# Altium footprint library Texas Instruments Footprints.PcbLib: 429 footprints (part 8 of 32)
Each footprint in its own frame and in the unit in brackets; x right, y up, seen from the top. Pads: shape width x height; smd on the part's side, far side on the other; paste and mask are expansions set on the pad; w line width, h text height; cw(c..) or ccw(c..) is an arc to the next point about the centre after c.
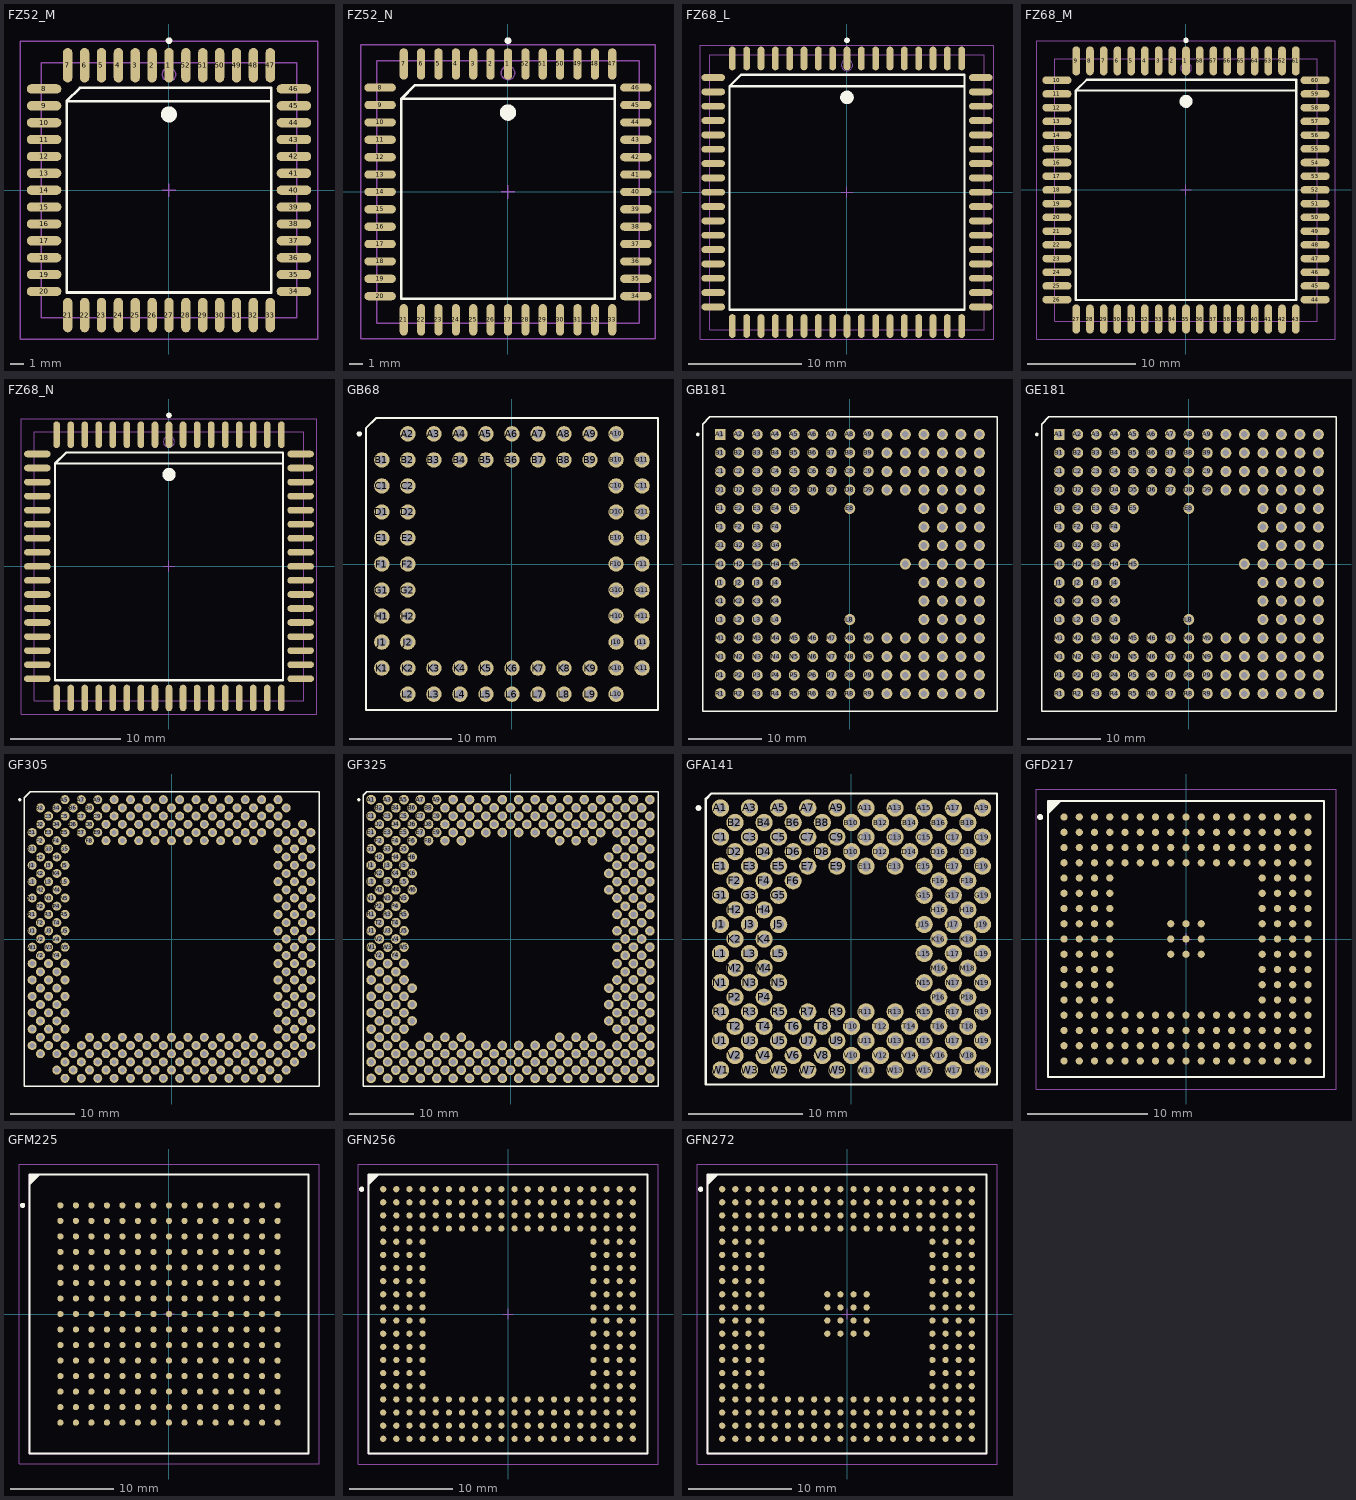
[diagram p7: the footprints below, top view; thin cyan lines are the x and y axes]

## FZ52_M [mm] "52-Pin Leaded Chip Carrier 1.27 mm Pitch, IPC Low Density"
height 4.57
pads (52):
  oval 0.7x2.6 smd: 1(0,9.4) 2(-1.27,9.4) 3(-2.54,9.4) 4(-3.81,9.4) 5(-5.08,9.4) 6(-6.35,9.4) 7(-7.62,9.4) 21(-7.62,-9.4) 22(-6.35,-9.4) 23(-5.08,-9.4) 24(-3.81,-9.4) 25(-2.54,-9.4) 26(-1.27,-9.4) 27(0,-9.4) 28(1.27,-9.4) 29(2.54,-9.4) 30(3.81,-9.4) 31(5.08,-9.4) 32(6.35,-9.4) 33(7.62,-9.4) 47(7.62,9.4) 48(6.35,9.4) 49(5.08,9.4) 50(3.81,9.4) 51(2.54,9.4) 52(1.27,9.4)
  oval 2.6x0.7 smd: 8(-9.4,7.62) 9(-9.4,6.35) 10(-9.4,5.08) 11(-9.4,3.81) 12(-9.4,2.54) 13(-9.4,1.27) 14(-9.4,0) 15(-9.4,-1.27) 16(-9.4,-2.54) 17(-9.4,-3.81) 18(-9.4,-5.08) 19(-9.4,-6.35) 20(-9.4,-7.62) 34(9.4,-7.62) 35(9.4,-6.35) 36(9.4,-5.08) 37(9.4,-3.81) 38(9.4,-2.54) 39(9.4,-1.27) 40(9.4,0) 41(9.4,1.27) 42(9.4,2.54) 43(9.4,3.81) 44(9.4,5.08) 45(9.4,6.35) 46(9.4,7.62)
Top Overlay:
  circle w0.25: c0,11.25 r0.125
  circle w0.6: c0,5.7 r0.3
  lines w0.2: 7.7,6.7 -7.7,6.7 ; -7.7,6.7 -6.7,7.7 7.7,7.7 7.7,-7.7 -7.7,-7.7 -7.7,6.7
Mechanical 13:
  circle w0.1: c0,8.7 r0.5
  lines w0.1: -9.6,-9.6 -9.6,9.6 9.6,9.6 9.6,-9.6 -9.6,-9.6
Mechanical 15:
  lines w0.1: -0.5,0 0.5,0 ; 0,-0.5 0,0.5 ; -11.2,-11.2 -11.2,11.2 11.2,11.2 11.2,-11.2 -11.2,-11.2
3D body: height 4.57, standoff 0, extent -9.6,-9.6 9.6,9.6

## FZ52_N [mm] "52-Pin Leaded Chip Carrier 1.27 mm Pitch, IPC Medium Density"
height 4.57
pads (52):
  oval 0.6x2.3 smd: 1(0,9.35) 2(-1.27,9.35) 3(-2.54,9.35) 4(-3.81,9.35) 5(-5.08,9.35) 6(-6.35,9.35) 7(-7.62,9.35) 21(-7.62,-9.35) 22(-6.35,-9.35) 23(-5.08,-9.35) 24(-3.81,-9.35) 25(-2.54,-9.35) 26(-1.27,-9.35) 27(0,-9.35) 28(1.27,-9.35) 29(2.54,-9.35) 30(3.81,-9.35) 31(5.08,-9.35) 32(6.35,-9.35) 33(7.62,-9.35) 47(7.62,9.35) 48(6.35,9.35) 49(5.08,9.35) 50(3.81,9.35) 51(2.54,9.35) 52(1.27,9.35)
  oval 2.3x0.6 smd: 8(-9.35,7.62) 9(-9.35,6.35) 10(-9.35,5.08) 11(-9.35,3.81) 12(-9.35,2.54) 13(-9.35,1.27) 14(-9.35,0) 15(-9.35,-1.27) 16(-9.35,-2.54) 17(-9.35,-3.81) 18(-9.35,-5.08) 19(-9.35,-6.35) 20(-9.35,-7.62) 34(9.35,-7.62) 35(9.35,-6.35) 36(9.35,-5.08) 37(9.35,-3.81) 38(9.35,-2.54) 39(9.35,-1.27) 40(9.35,0) 41(9.35,1.27) 42(9.35,2.54) 43(9.35,3.81) 44(9.35,5.08) 45(9.35,6.35) 46(9.35,7.62)
Top Overlay:
  circle w0.25: c0,11.05 r0.125
  circle w0.6: c0,5.8 r0.3
  lines w0.2: 7.8,6.8 -7.8,6.8 ; -7.8,6.8 -6.8,7.8 7.8,7.8 7.8,-7.8 -7.8,-7.8 -7.8,6.8
Mechanical 13:
  circle w0.1: c0,8.7 r0.5
  lines w0.1: -9.6,-9.6 -9.6,9.6 9.6,9.6 9.6,-9.6 -9.6,-9.6
Mechanical 15:
  lines w0.1: -0.5,0 0.5,0 ; 0,-0.5 0,0.5 ; -10.75,-10.75 -10.75,10.75 10.75,10.75 10.75,-10.75 -10.75,-10.75
3D body: height 4.57, standoff 0, extent -9.6,-9.6 9.6,9.6

## FZ68_L [mm] "68-Pin Leaded Chip Carrier 1.27 mm Pitch, IPC High Density"
height 4.57
pads (68):
  oval 0.6x2.1 smd: 1(0,11.85) 2(-1.27,11.85) 3(-2.54,11.85) 4(-3.81,11.85) 5(-5.08,11.85) 6(-6.35,11.85) 7(-7.62,11.85) 8(-8.89,11.85) 9(-10.16,11.85) 27(-10.16,-11.85) 28(-8.89,-11.85) 29(-7.62,-11.85) 30(-6.35,-11.85) 31(-5.08,-11.85) 32(-3.81,-11.85) 33(-2.54,-11.85) 34(-1.27,-11.85) 35(0,-11.85) 36(1.27,-11.85) 37(2.54,-11.85) 38(3.81,-11.85) 39(5.08,-11.85) 40(6.35,-11.85) 41(7.62,-11.85) 42(8.89,-11.85) 43(10.16,-11.85) 61(10.16,11.85) 62(8.89,11.85) 63(7.62,11.85) 64(6.35,11.85) 65(5.08,11.85) 66(3.81,11.85) 67(2.54,11.85) 68(1.27,11.85)
  oval 2.1x0.6 smd: 10(-11.85,10.16) 11(-11.85,8.89) 12(-11.85,7.62) 13(-11.85,6.35) 14(-11.85,5.08) 15(-11.85,3.81) 16(-11.85,2.54) 17(-11.85,1.27) 18(-11.85,0) 19(-11.85,-1.27) 20(-11.85,-2.54) 21(-11.85,-3.81) 22(-11.85,-5.08) 23(-11.85,-6.35) 24(-11.85,-7.62) 25(-11.85,-8.89) 26(-11.85,-10.16) 44(11.85,-10.16) 45(11.85,-8.89) 46(11.85,-7.62) 47(11.85,-6.35) 48(11.85,-5.08) 49(11.85,-3.81) 50(11.85,-2.54) 51(11.85,-1.27) 52(11.85,0) 53(11.85,1.27) 54(11.85,2.54) 55(11.85,3.81) 56(11.85,5.08) 57(11.85,6.35) 58(11.85,7.62) 59(11.85,8.89) 60(11.85,10.16)
Top Overlay:
  circle w0.25: c0,13.45 r0.125
  circle w0.6: c0,8.4 r0.3
  lines w0.2: 10.4,9.4 -10.4,9.4 ; -10.4,9.4 -9.4,10.4 10.4,10.4 10.4,-10.4 -10.4,-10.4 -10.4,9.4
Mechanical 13:
  circle w0.1: c0,11.265 r0.5
  lines w0.1: -12.165,-12.165 -12.165,12.165 12.165,12.165 12.165,-12.165 -12.165,-12.165
Mechanical 15:
  lines w0.1: -0.5,0 0.5,0 ; 0,-0.5 0,0.5 ; -13,-13 -13,13 13,13 13,-13 -13,-13
3D body: height 4.57, standoff 0, extent -12.165,-12.165 12.165,12.165

## FZ68_M [mm] "68-Pin Leaded Chip Carrier 1.27 mm Pitch, IPC Low Density"
height 4.57
pads (68):
  oval 0.7x2.7 smd: 1(0,11.95) 2(-1.27,11.95) 3(-2.54,11.95) 4(-3.81,11.95) 5(-5.08,11.95) 6(-6.35,11.95) 7(-7.62,11.95) 8(-8.89,11.95) 9(-10.16,11.95) 27(-10.16,-11.95) 28(-8.89,-11.95) 29(-7.62,-11.95) 30(-6.35,-11.95) 31(-5.08,-11.95) 32(-3.81,-11.95) 33(-2.54,-11.95) 34(-1.27,-11.95) 35(0,-11.95) 36(1.27,-11.95) 37(2.54,-11.95) 38(3.81,-11.95) 39(5.08,-11.95) 40(6.35,-11.95) 41(7.62,-11.95) 42(8.89,-11.95) 43(10.16,-11.95) 61(10.16,11.95) 62(8.89,11.95) 63(7.62,11.95) 64(6.35,11.95) 65(5.08,11.95) 66(3.81,11.95) 67(2.54,11.95) 68(1.27,11.95)
  oval 2.7x0.7 smd: 10(-11.95,10.16) 11(-11.95,8.89) 12(-11.95,7.62) 13(-11.95,6.35) 14(-11.95,5.08) 15(-11.95,3.81) 16(-11.95,2.54) 17(-11.95,1.27) 18(-11.95,0) 19(-11.95,-1.27) 20(-11.95,-2.54) 21(-11.95,-3.81) 22(-11.95,-5.08) 23(-11.95,-6.35) 24(-11.95,-7.62) 25(-11.95,-8.89) 26(-11.95,-10.16) 44(11.95,-10.16) 45(11.95,-8.89) 46(11.95,-7.62) 47(11.95,-6.35) 48(11.95,-5.08) 49(11.95,-3.81) 50(11.95,-2.54) 51(11.95,-1.27) 52(11.95,0) 53(11.95,1.27) 54(11.95,2.54) 55(11.95,3.81) 56(11.95,5.08) 57(11.95,6.35) 58(11.95,7.62) 59(11.95,8.89) 60(11.95,10.16)
Top Overlay:
  circle w0.25: c0,13.85 r0.125
  circle w0.6: c0,8.2 r0.3
  lines w0.2: 10.2,9.2 -10.2,9.2 ; -10.2,9.2 -9.2,10.2 10.2,10.2 10.2,-10.2 -10.2,-10.2 -10.2,9.2
Mechanical 13:
  circle w0.1: c0,11.265 r0.5
  lines w0.1: -12.165,-12.165 -12.165,12.165 12.165,12.165 12.165,-12.165 -12.165,-12.165
Mechanical 15:
  lines w0.1: -0.5,0 0.5,0 ; 0,-0.5 0,0.5 ; -13.8,-13.8 -13.8,13.8 13.8,13.8 13.8,-13.8 -13.8,-13.8
3D body: height 4.57, standoff 0, extent -12.165,-12.165 12.165,12.165

## FZ68_N [mm] "68-Pin Leaded Chip Carrier 1.27 mm Pitch, IPC Medium Density"
height 4.57
pads (68):
  oval 0.6x2.4 smd: 1(0,11.9) 2(-1.27,11.9) 3(-2.54,11.9) 4(-3.81,11.9) 5(-5.08,11.9) 6(-6.35,11.9) 7(-7.62,11.9) 8(-8.89,11.9) 9(-10.16,11.9) 27(-10.16,-11.9) 28(-8.89,-11.9) 29(-7.62,-11.9) 30(-6.35,-11.9) 31(-5.08,-11.9) 32(-3.81,-11.9) 33(-2.54,-11.9) 34(-1.27,-11.9) 35(0,-11.9) 36(1.27,-11.9) 37(2.54,-11.9) 38(3.81,-11.9) 39(5.08,-11.9) 40(6.35,-11.9) 41(7.62,-11.9) 42(8.89,-11.9) 43(10.16,-11.9) 61(10.16,11.9) 62(8.89,11.9) 63(7.62,11.9) 64(6.35,11.9) 65(5.08,11.9) 66(3.81,11.9) 67(2.54,11.9) 68(1.27,11.9)
  oval 2.4x0.6 smd: 10(-11.9,10.16) 11(-11.9,8.89) 12(-11.9,7.62) 13(-11.9,6.35) 14(-11.9,5.08) 15(-11.9,3.81) 16(-11.9,2.54) 17(-11.9,1.27) 18(-11.9,0) 19(-11.9,-1.27) 20(-11.9,-2.54) 21(-11.9,-3.81) 22(-11.9,-5.08) 23(-11.9,-6.35) 24(-11.9,-7.62) 25(-11.9,-8.89) 26(-11.9,-10.16) 44(11.9,-10.16) 45(11.9,-8.89) 46(11.9,-7.62) 47(11.9,-6.35) 48(11.9,-5.08) 49(11.9,-3.81) 50(11.9,-2.54) 51(11.9,-1.27) 52(11.9,0) 53(11.9,1.27) 54(11.9,2.54) 55(11.9,3.81) 56(11.9,5.08) 57(11.9,6.35) 58(11.9,7.62) 59(11.9,8.89) 60(11.9,10.16)
Top Overlay:
  circle w0.25: c0,13.65 r0.125
  circle w0.6: c0,8.3 r0.3
  lines w0.2: 10.3,9.3 -10.3,9.3 ; -10.3,9.3 -9.3,10.3 10.3,10.3 10.3,-10.3 -10.3,-10.3 -10.3,9.3
Mechanical 13:
  circle w0.1: c0,11.265 r0.5
  lines w0.1: -12.165,-12.165 -12.165,12.165 12.165,12.165 12.165,-12.165 -12.165,-12.165
Mechanical 15:
  lines w0.1: -0.5,0 0.5,0 ; 0,-0.5 0,0.5 ; -13.35,-13.35 -13.35,13.35 13.35,13.35 13.35,-13.35 -13.35,-13.35
3D body: height 4.57, standoff 0, extent -12.165,-12.165 12.165,12.165

## GB68 [mm] "68-Pin Pin Grid Array 2.54 mm Pitch"
height 5.27
pads (68):
  round 1.5 hole 0.9: A2(-10.16,12.7) A3(-7.62,12.7) A4(-5.08,12.7) A5(-2.54,12.7) A6(0,12.7) A7(2.54,12.7) A8(5.08,12.7) A9(7.62,12.7) A10(10.16,12.7) B1(-12.7,10.16) B2(-10.16,10.16) B3(-7.62,10.16) B4(-5.08,10.16) B5(-2.54,10.16) B6(0,10.16) B7(2.54,10.16) B8(5.08,10.16) B9(7.62,10.16) B10(10.16,10.16) B11(12.7,10.16) C1(-12.7,7.62) C2(-10.16,7.62) C10(10.16,7.62) C11(12.7,7.62) D1(-12.7,5.08) D2(-10.16,5.08) D10(10.16,5.08) D11(12.7,5.08) E1(-12.7,2.54) E2(-10.16,2.54) E10(10.16,2.54) E11(12.7,2.54) F1(-12.7,0) F2(-10.16,0) F10(10.16,0) F11(12.7,0) G1(-12.7,-2.54) G2(-10.16,-2.54) G10(10.16,-2.54) G11(12.7,-2.54) H1(-12.7,-5.08) H2(-10.16,-5.08) H10(10.16,-5.08) H11(12.7,-5.08) J1(-12.7,-7.62) J2(-10.16,-7.62) J10(10.16,-7.62) J11(12.7,-7.62) K1(-12.7,-10.16) K2(-10.16,-10.16) K3(-7.62,-10.16) K4(-5.08,-10.16) K5(-2.54,-10.16) K6(0,-10.16) K7(2.54,-10.16) K8(5.08,-10.16) K9(7.62,-10.16) K10(10.16,-10.16) K11(12.7,-10.16) L2(-10.16,-12.7) L3(-7.62,-12.7) L4(-5.08,-12.7) L5(-2.54,-12.7) L6(0,-12.7) L7(2.54,-12.7) L8(5.08,-12.7) L9(7.62,-12.7) L10(10.16,-12.7)
Top Overlay:
  circle w0.25: c-14.9,12.7 r0.125
  lines w0.2: -14.25,-14.25 -14.25,13.25 -13.25,14.25 14.25,14.25 14.25,-14.25 -14.25,-14.25

## GB181 [mm] "181-Pin Pin Grid Array 2.54 mm Pitch"
height 4.85
pads (181):
  rect 1.5x1.5 hole 0.9: A1(-17.78,17.78)
  round 1.5 hole 0.9: A2(-15.24,17.78) A3(-12.7,17.78) A4(-10.16,17.78) A5(-7.62,17.78) A6(-5.08,17.78) A7(-2.54,17.78) A8(0,17.78) A9(2.54,17.78) A10(5.08,17.78) A11(7.62,17.78) A12(10.16,17.78) A13(12.7,17.78) A14(15.24,17.78) A15(17.78,17.78) B1(-17.78,15.24) B2(-15.24,15.24) B3(-12.7,15.24) B4(-10.16,15.24) B5(-7.62,15.24) B6(-5.08,15.24) B7(-2.54,15.24) B8(0,15.24) B9(2.54,15.24) B10(5.08,15.24) B11(7.62,15.24) B12(10.16,15.24) B13(12.7,15.24) B14(15.24,15.24) B15(17.78,15.24) C1(-17.78,12.7) C2(-15.24,12.7) C3(-12.7,12.7) C4(-10.16,12.7) C5(-7.62,12.7) C6(-5.08,12.7) C7(-2.54,12.7) C8(0,12.7) C9(2.54,12.7) C10(5.08,12.7) C11(7.62,12.7) C12(10.16,12.7) C13(12.7,12.7) C14(15.24,12.7) C15(17.78,12.7) D1(-17.78,10.16) D2(-15.24,10.16) D3(-12.7,10.16) D4(-10.16,10.16) D5(-7.62,10.16) D6(-5.08,10.16) D7(-2.54,10.16) D8(0,10.16) D9(2.54,10.16) D10(5.08,10.16) D11(7.62,10.16) D12(10.16,10.16) D13(12.7,10.16) D14(15.24,10.16) D15(17.78,10.16) E1(-17.78,7.62) E2(-15.24,7.62) E3(-12.7,7.62) E4(-10.16,7.62) E5(-7.62,7.62) E8(0,7.62) E12(10.16,7.62) E13(12.7,7.62) E14(15.24,7.62) E15(17.78,7.62) F1(-17.78,5.08) F2(-15.24,5.08) F3(-12.7,5.08) F4(-10.16,5.08) F12(10.16,5.08) F13(12.7,5.08) F14(15.24,5.08) F15(17.78,5.08) G1(-17.78,2.54) G2(-15.24,2.54) G3(-12.7,2.54) G4(-10.16,2.54) G12(10.16,2.54) G13(12.7,2.54) G14(15.24,2.54) G15(17.78,2.54) H1(-17.78,0) H2(-15.24,0) H3(-12.7,0) H4(-10.16,0) H5(-7.62,0) H11(7.62,0) H12(10.16,0) H13(12.7,0) H14(15.24,0) H15(17.78,0) J1(-17.78,-2.54) J2(-15.24,-2.54) J3(-12.7,-2.54) J4(-10.16,-2.54) J12(10.16,-2.54) J13(12.7,-2.54) J14(15.24,-2.54) J15(17.78,-2.54) K1(-17.78,-5.08) K2(-15.24,-5.08) K3(-12.7,-5.08) K4(-10.16,-5.08) K12(10.16,-5.08) K13(12.7,-5.08) K14(15.24,-5.08) K15(17.78,-5.08) L1(-17.78,-7.62) L2(-15.24,-7.62) L3(-12.7,-7.62) L4(-10.16,-7.62) L8(0,-7.62) L12(10.16,-7.62) L13(12.7,-7.62) L14(15.24,-7.62) L15(17.78,-7.62) M1(-17.78,-10.16) M2(-15.24,-10.16) M3(-12.7,-10.16) M4(-10.16,-10.16) M5(-7.62,-10.16) M6(-5.08,-10.16) M7(-2.54,-10.16) M8(0,-10.16) M9(2.54,-10.16) M10(5.08,-10.16) M11(7.62,-10.16) M12(10.16,-10.16) M13(12.7,-10.16) M14(15.24,-10.16) M15(17.78,-10.16) N1(-17.78,-12.7) N2(-15.24,-12.7) N3(-12.7,-12.7) N4(-10.16,-12.7) N5(-7.62,-12.7) N6(-5.08,-12.7) N7(-2.54,-12.7) N8(0,-12.7) N9(2.54,-12.7) N10(5.08,-12.7) N11(7.62,-12.7) N12(10.16,-12.7) N13(12.7,-12.7) N14(15.24,-12.7) N15(17.78,-12.7) P1(-17.78,-15.24) P2(-15.24,-15.24) P3(-12.7,-15.24) P4(-10.16,-15.24) P5(-7.62,-15.24) P6(-5.08,-15.24) P7(-2.54,-15.24) P8(0,-15.24) P9(2.54,-15.24) P10(5.08,-15.24) P11(7.62,-15.24) P12(10.16,-15.24) P13(12.7,-15.24) P14(15.24,-15.24) P15(17.78,-15.24) R1(-17.78,-17.78) R2(-15.24,-17.78) R3(-12.7,-17.78) R4(-10.16,-17.78) R5(-7.62,-17.78) R6(-5.08,-17.78) R7(-2.54,-17.78) R8(0,-17.78) R9(2.54,-17.78) R10(5.08,-17.78) R11(7.62,-17.78) R12(10.16,-17.78) R13(12.7,-17.78) R14(15.24,-17.78) R15(17.78,-17.78)
Top Overlay:
  circle w0.25: c-20.85,17.78 r0.125
  lines w0.2: -20.2,-20.2 -20.2,19.2 -19.2,20.2 20.2,20.2 20.2,-20.2 -20.2,-20.2

## GE181 [mm] "181-Pin Pin Grid Array 2.54 mm Pitch"
height 6.22
pads (181):
  rect 1.5x1.5 hole 0.9: A1(-17.78,17.78)
  round 1.5 hole 0.9: A2(-15.24,17.78) A3(-12.7,17.78) A4(-10.16,17.78) A5(-7.62,17.78) A6(-5.08,17.78) A7(-2.54,17.78) A8(0,17.78) A9(2.54,17.78) A10(5.08,17.78) A11(7.62,17.78) A12(10.16,17.78) A13(12.7,17.78) A14(15.24,17.78) A15(17.78,17.78) B1(-17.78,15.24) B2(-15.24,15.24) B3(-12.7,15.24) B4(-10.16,15.24) B5(-7.62,15.24) B6(-5.08,15.24) B7(-2.54,15.24) B8(0,15.24) B9(2.54,15.24) B10(5.08,15.24) B11(7.62,15.24) B12(10.16,15.24) B13(12.7,15.24) B14(15.24,15.24) B15(17.78,15.24) C1(-17.78,12.7) C2(-15.24,12.7) C3(-12.7,12.7) C4(-10.16,12.7) C5(-7.62,12.7) C6(-5.08,12.7) C7(-2.54,12.7) C8(0,12.7) C9(2.54,12.7) C10(5.08,12.7) C11(7.62,12.7) C12(10.16,12.7) C13(12.7,12.7) C14(15.24,12.7) C15(17.78,12.7) D1(-17.78,10.16) D2(-15.24,10.16) D3(-12.7,10.16) D4(-10.16,10.16) D5(-7.62,10.16) D6(-5.08,10.16) D7(-2.54,10.16) D8(0,10.16) D9(2.54,10.16) D10(5.08,10.16) D11(7.62,10.16) D12(10.16,10.16) D13(12.7,10.16) D14(15.24,10.16) D15(17.78,10.16) E1(-17.78,7.62) E2(-15.24,7.62) E3(-12.7,7.62) E4(-10.16,7.62) E5(-7.62,7.62) E8(0,7.62) E12(10.16,7.62) E13(12.7,7.62) E14(15.24,7.62) E15(17.78,7.62) F1(-17.78,5.08) F2(-15.24,5.08) F3(-12.7,5.08) F4(-10.16,5.08) F12(10.16,5.08) F13(12.7,5.08) F14(15.24,5.08) F15(17.78,5.08) G1(-17.78,2.54) G2(-15.24,2.54) G3(-12.7,2.54) G4(-10.16,2.54) G12(10.16,2.54) G13(12.7,2.54) G14(15.24,2.54) G15(17.78,2.54) H1(-17.78,0) H2(-15.24,0) H3(-12.7,0) H4(-10.16,0) H5(-7.62,0) H11(7.62,0) H12(10.16,0) H13(12.7,0) H14(15.24,0) H15(17.78,0) J1(-17.78,-2.54) J2(-15.24,-2.54) J3(-12.7,-2.54) J4(-10.16,-2.54) J12(10.16,-2.54) J13(12.7,-2.54) J14(15.24,-2.54) J15(17.78,-2.54) K1(-17.78,-5.08) K2(-15.24,-5.08) K3(-12.7,-5.08) K4(-10.16,-5.08) K12(10.16,-5.08) K13(12.7,-5.08) K14(15.24,-5.08) K15(17.78,-5.08) L1(-17.78,-7.62) L2(-15.24,-7.62) L3(-12.7,-7.62) L4(-10.16,-7.62) L8(0,-7.62) L12(10.16,-7.62) L13(12.7,-7.62) L14(15.24,-7.62) L15(17.78,-7.62) M1(-17.78,-10.16) M2(-15.24,-10.16) M3(-12.7,-10.16) M4(-10.16,-10.16) M5(-7.62,-10.16) M6(-5.08,-10.16) M7(-2.54,-10.16) M8(0,-10.16) M9(2.54,-10.16) M10(5.08,-10.16) M11(7.62,-10.16) M12(10.16,-10.16) M13(12.7,-10.16) M14(15.24,-10.16) M15(17.78,-10.16) N1(-17.78,-12.7) N2(-15.24,-12.7) N3(-12.7,-12.7) N4(-10.16,-12.7) N5(-7.62,-12.7) N6(-5.08,-12.7) N7(-2.54,-12.7) N8(0,-12.7) N9(2.54,-12.7) N10(5.08,-12.7) N11(7.62,-12.7) N12(10.16,-12.7) N13(12.7,-12.7) N14(15.24,-12.7) N15(17.78,-12.7) P1(-17.78,-15.24) P2(-15.24,-15.24) P3(-12.7,-15.24) P4(-10.16,-15.24) P5(-7.62,-15.24) P6(-5.08,-15.24) P7(-2.54,-15.24) P8(0,-15.24) P9(2.54,-15.24) P10(5.08,-15.24) P11(7.62,-15.24) P12(10.16,-15.24) P13(12.7,-15.24) P14(15.24,-15.24) P15(17.78,-15.24) R1(-17.78,-17.78) R2(-15.24,-17.78) R3(-12.7,-17.78) R4(-10.16,-17.78) R5(-7.62,-17.78) R6(-5.08,-17.78) R7(-2.54,-17.78) R8(0,-17.78) R9(2.54,-17.78) R10(5.08,-17.78) R11(7.62,-17.78) R12(10.16,-17.78) R13(12.7,-17.78) R14(15.24,-17.78) R15(17.78,-17.78)
Top Overlay:
  circle w0.25: c-20.85,17.78 r0.125
  lines w0.2: -20.2,-20.2 -20.2,19.2 -19.2,20.2 20.2,20.2 20.2,-20.2 -20.2,-20.2

## GF305 [mm] "305-Pin Pin Grid Array 2.54 mm Pitch"
height 5.59
pads (305):
  round 1.4 hole 0.8: A5(-16.51,21.59) A7(-13.97,21.59) A9(-11.43,21.59) A11(-8.89,21.59) A13(-6.35,21.59) A15(-3.81,21.59) A17(-1.27,21.59) A19(1.27,21.59) A21(3.81,21.59) A23(6.35,21.59) A25(8.89,21.59) A27(11.43,21.59) A29(13.97,21.59) A31(16.51,21.59) AA1(-21.59,-3.81) AA3(-19.05,-3.81) AA5(-16.51,-3.81) AA31(16.51,-3.81) AA33(19.05,-3.81) AA35(21.59,-3.81) AB2(-20.32,-5.08) AB4(-17.78,-5.08) AB32(17.78,-5.08) AB34(20.32,-5.08) AC1(-21.59,-6.35) AC3(-19.05,-6.35) AC5(-16.51,-6.35) AC31(16.51,-6.35) AC33(19.05,-6.35) AC35(21.59,-6.35) AD2(-20.32,-7.62) AD4(-17.78,-7.62) AD32(17.78,-7.62) AD34(20.32,-7.62) AE1(-21.59,-8.89) AE3(-19.05,-8.89) AE5(-16.51,-8.89) AE31(16.51,-8.89) AE33(19.05,-8.89) AE35(21.59,-8.89) AF2(-20.32,-10.16) AF4(-17.78,-10.16) AF32(17.78,-10.16) AF34(20.32,-10.16) AG1(-21.59,-11.43) AG3(-19.05,-11.43) AG5(-16.51,-11.43) AG31(16.51,-11.43) AG33(19.05,-11.43) AG35(21.59,-11.43) AH2(-20.32,-12.7) AH4(-17.78,-12.7) AH32(17.78,-12.7) AH34(20.32,-12.7) AJ1(-21.59,-13.97) AJ3(-19.05,-13.97) AJ5(-16.51,-13.97) AJ31(16.51,-13.97) AJ33(19.05,-13.97) AJ35(21.59,-13.97) AK2(-20.32,-15.24) AK4(-17.78,-15.24) AK8(-12.7,-15.24) AK10(-10.16,-15.24) AK12(-7.62,-15.24) AK14(-5.08,-15.24) AK16(-2.54,-15.24) AK18(0,-15.24) AK20(2.54,-15.24) AK22(5.08,-15.24) AK24(7.62,-15.24) AK26(10.16,-15.24) AK28(12.7,-15.24) AK32(17.78,-15.24) AK34(20.32,-15.24) AL1(-21.59,-16.51) AL3(-19.05,-16.51) AL5(-16.51,-16.51) AL7(-13.97,-16.51) AL9(-11.43,-16.51) AL11(-8.89,-16.51) AL13(-6.35,-16.51) AL15(-3.81,-16.51) AL17(-1.27,-16.51) AL19(1.27,-16.51) AL21(3.81,-16.51) AL23(6.35,-16.51) AL25(8.89,-16.51) AL27(11.43,-16.51) AL29(13.97,-16.51) AL31(16.51,-16.51) AL33(19.05,-16.51) AL35(21.59,-16.51) AM2(-20.32,-17.78) AM4(-17.78,-17.78) AM6(-15.24,-17.78) AM8(-12.7,-17.78) AM10(-10.16,-17.78) AM12(-7.62,-17.78) AM14(-5.08,-17.78) AM16(-2.54,-17.78) AM18(0,-17.78) AM20(2.54,-17.78) AM22(5.08,-17.78) AM24(7.62,-17.78) AM26(10.16,-17.78) AM28(12.7,-17.78) AM30(15.24,-17.78) AM32(17.78,-17.78) AM34(20.32,-17.78) AN5(-16.51,-19.05) AN7(-13.97,-19.05) AN9(-11.43,-19.05) AN11(-8.89,-19.05) AN13(-6.35,-19.05) AN15(-3.81,-19.05) AN17(-1.27,-19.05) AN19(1.27,-19.05) AN21(3.81,-19.05) AN23(6.35,-19.05) AN25(8.89,-19.05) AN27(11.43,-19.05) AN29(13.97,-19.05) AN31(16.51,-19.05) AN33(19.05,-19.05) AP4(-17.78,-20.32) AP6(-15.24,-20.32) AP8(-12.7,-20.32) AP10(-10.16,-20.32) AP12(-7.62,-20.32) AP14(-5.08,-20.32) AP16(-2.54,-20.32) AP18(0,-20.32) AP20(2.54,-20.32) AP22(5.08,-20.32) AP24(7.62,-20.32) AP26(10.16,-20.32) AP28(12.7,-20.32) AP30(15.24,-20.32) AP32(17.78,-20.32) AR5(-16.51,-21.59) AR7(-13.97,-21.59) AR9(-11.43,-21.59) AR11(-8.89,-21.59) AR13(-6.35,-21.59) AR15(-3.81,-21.59) AR17(-1.27,-21.59) AR19(1.27,-21.59) AR21(3.81,-21.59) AR23(6.35,-21.59) AR25(8.89,-21.59) AR27(11.43,-21.59) AR29(13.97,-21.59) AR31(16.51,-21.59) B2(-20.32,20.32) B4(-17.78,20.32) B6(-15.24,20.32) B8(-12.7,20.32) B10(-10.16,20.32) B12(-7.62,20.32) B14(-5.08,20.32) B16(-2.54,20.32) B18(0,20.32) B20(2.54,20.32) B22(5.08,20.32) B24(7.62,20.32) B26(10.16,20.32) B28(12.7,20.32) B30(15.24,20.32) B32(17.78,20.32) C3(-19.05,19.05) C5(-16.51,19.05) C7(-13.97,19.05) C9(-11.43,19.05) C11(-8.89,19.05) C13(-6.35,19.05) C15(-3.81,19.05) C17(-1.27,19.05) C19(1.27,19.05) C21(3.81,19.05) C23(6.35,19.05) C25(8.89,19.05) C27(11.43,19.05) C29(13.97,19.05) C31(16.51,19.05) D2(-20.32,17.78) D4(-17.78,17.78) D6(-15.24,17.78) D8(-12.7,17.78) D10(-10.16,17.78) D12(-7.62,17.78) D14(-5.08,17.78) D16(-2.54,17.78) D18(0,17.78) D20(2.54,17.78) D22(5.08,17.78) D24(7.62,17.78) D26(10.16,17.78) D28(12.7,17.78) D30(15.24,17.78) D32(17.78,17.78) D34(20.32,17.78) E1(-21.59,16.51) E3(-19.05,16.51) E5(-16.51,16.51) E7(-13.97,16.51) E9(-11.43,16.51) E11(-8.89,16.51) E13(-6.35,16.51) E15(-3.81,16.51) E17(-1.27,16.51) E19(1.27,16.51) E21(3.81,16.51) E23(6.35,16.51) E25(8.89,16.51) E27(11.43,16.51) E29(13.97,16.51) E31(16.51,16.51) E33(19.05,16.51) E35(21.59,16.51) F2(-20.32,15.24) F4(-17.78,15.24) F8(-12.7,15.24) F10(-10.16,15.24) F12(-7.62,15.24) F14(-5.08,15.24) F16(-2.54,15.24) F18(0,15.24) F20(2.54,15.24) F22(5.08,15.24) F24(7.62,15.24) F26(10.16,15.24) F28(12.7,15.24) F32(17.78,15.24) F34(20.32,15.24) G1(-21.59,13.97) G3(-19.05,13.97) G5(-16.51,13.97) G31(16.51,13.97) G33(19.05,13.97) G35(21.59,13.97) H2(-20.32,12.7) H4(-17.78,12.7) H32(17.78,12.7) H34(20.32,12.7) J1(-21.59,11.43) J3(-19.05,11.43) J5(-16.51,11.43) J31(16.51,11.43) J33(19.05,11.43) J35(21.59,11.43) K2(-20.32,10.16) K4(-17.78,10.16) K32(17.78,10.16) K34(20.32,10.16) L1(-21.59,8.89) L3(-19.05,8.89) L5(-16.51,8.89) L31(16.51,8.89) L33(19.05,8.89) L35(21.59,8.89) M2(-20.32,7.62) M4(-17.78,7.62) M32(17.78,7.62) M34(20.32,7.62) N1(-21.59,6.35) N3(-19.05,6.35) N5(-16.51,6.35) N31(16.51,6.35) N33(19.05,6.35) N35(21.59,6.35) P2(-20.32,5.08) P4(-17.78,5.08) P32(17.78,5.08) P34(20.32,5.08) R1(-21.59,3.81) R3(-19.05,3.81) R5(-16.51,3.81) R31(16.51,3.81) R33(19.05,3.81) R35(21.59,3.81) T2(-20.32,2.54) T4(-17.78,2.54) T32(17.78,2.54) T34(20.32,2.54) U1(-21.59,1.27) U3(-19.05,1.27) U5(-16.51,1.27) U31(16.51,1.27) U33(19.05,1.27) U35(21.59,1.27) V2(-20.32,0) V4(-17.78,0) V32(17.78,0) V34(20.32,0) W1(-21.59,-1.27) W3(-19.05,-1.27) W5(-16.51,-1.27) W31(16.51,-1.27) W33(19.05,-1.27) W35(21.59,-1.27) Y2(-20.32,-2.54) Y4(-17.78,-2.54) Y32(17.78,-2.54) Y34(20.32,-2.54)
Top Overlay:
  circle w0.25: c-23.51,21.59 r0.125
  lines w0.2: -22.86,-22.86 -22.86,21.86 -21.86,22.86 22.86,22.86 22.86,-22.86 -22.86,-22.86

## GF325 [mm] "325-Pin Pin Grid Array 2.54 mm Pitch"
height 5.08
pads (325):
  round 1.5 hole 0.9: A1(-21.59,21.59) A3(-19.05,21.59) A5(-16.51,21.59) A7(-13.97,21.59) A9(-11.43,21.59) A11(-8.89,21.59) A13(-6.35,21.59) A15(-3.81,21.59) A17(-1.27,21.59) A19(1.27,21.59) A21(3.81,21.59) A23(6.35,21.59) A25(8.89,21.59) A27(11.43,21.59) A29(13.97,21.59) A31(16.51,21.59) A33(19.05,21.59) A35(21.59,21.59) AA1(-21.59,-3.81) AA3(-19.05,-3.81) AA5(-16.51,-3.81) AA31(16.51,-3.81) AA33(19.05,-3.81) AA35(21.59,-3.81) AB2(-20.32,-5.08) AB4(-17.78,-5.08) AB32(17.78,-5.08) AB34(20.32,-5.08) AC1(-21.59,-6.35) AC3(-19.05,-6.35) AC5(-16.51,-6.35) AC31(16.51,-6.35) AC33(19.05,-6.35) AC35(21.59,-6.35) AD2(-20.32,-7.62) AD4(-17.78,-7.62) AD6(-15.24,-7.62) AD30(15.24,-7.62) AD32(17.78,-7.62) AD34(20.32,-7.62) AE1(-21.59,-8.89) AE3(-19.05,-8.89) AE5(-16.51,-8.89) AE31(16.51,-8.89) AE33(19.05,-8.89) AE35(21.59,-8.89) AF2(-20.32,-10.16) AF4(-17.78,-10.16) AF6(-15.24,-10.16) AF30(15.24,-10.16) AF32(17.78,-10.16) AF34(20.32,-10.16) AG1(-21.59,-11.43) AG3(-19.05,-11.43) AG5(-16.51,-11.43) AG31(16.51,-11.43) AG33(19.05,-11.43) AG35(21.59,-11.43) AH2(-20.32,-12.7) AH4(-17.78,-12.7) AH6(-15.24,-12.7) AH30(15.24,-12.7) AH32(17.78,-12.7) AH34(20.32,-12.7) AJ1(-21.59,-13.97) AJ3(-19.05,-13.97) AJ5(-16.51,-13.97) AJ31(16.51,-13.97) AJ33(19.05,-13.97) AJ35(21.59,-13.97) AK2(-20.32,-15.24) AK4(-17.78,-15.24) AK8(-12.7,-15.24) AK10(-10.16,-15.24) AK12(-7.62,-15.24) AK24(7.62,-15.24) AK26(10.16,-15.24) AK28(12.7,-15.24) AK32(17.78,-15.24) AK34(20.32,-15.24) AL1(-21.59,-16.51) AL3(-19.05,-16.51) AL5(-16.51,-16.51) AL7(-13.97,-16.51) AL9(-11.43,-16.51) AL11(-8.89,-16.51) AL13(-6.35,-16.51) AL15(-3.81,-16.51) AL17(-1.27,-16.51) AL19(1.27,-16.51) AL21(3.81,-16.51) AL23(6.35,-16.51) AL25(8.89,-16.51) AL27(11.43,-16.51) AL29(13.97,-16.51) AL31(16.51,-16.51) AL33(19.05,-16.51) AL35(21.59,-16.51) AM2(-20.32,-17.78) AM4(-17.78,-17.78) AM6(-15.24,-17.78) AM8(-12.7,-17.78) AM10(-10.16,-17.78) AM12(-7.62,-17.78) AM14(-5.08,-17.78) AM16(-2.54,-17.78) AM18(0,-17.78) AM20(2.54,-17.78) AM22(5.08,-17.78) AM24(7.62,-17.78) AM26(10.16,-17.78) AM28(12.7,-17.78) AM30(15.24,-17.78) AM32(17.78,-17.78) AM34(20.32,-17.78) AN1(-21.59,-19.05) AN3(-19.05,-19.05) AN5(-16.51,-19.05) AN7(-13.97,-19.05) AN9(-11.43,-19.05) AN11(-8.89,-19.05) AN13(-6.35,-19.05) AN15(-3.81,-19.05) AN17(-1.27,-19.05) AN19(1.27,-19.05) AN21(3.81,-19.05) AN23(6.35,-19.05) AN25(8.89,-19.05) AN27(11.43,-19.05) AN29(13.97,-19.05) AN31(16.51,-19.05) AN33(19.05,-19.05) AN35(21.59,-19.05) AP2(-20.32,-20.32) AP4(-17.78,-20.32) AP6(-15.24,-20.32) AP8(-12.7,-20.32) AP10(-10.16,-20.32) AP12(-7.62,-20.32) AP14(-5.08,-20.32) AP16(-2.54,-20.32) AP18(0,-20.32) AP20(2.54,-20.32) AP22(5.08,-20.32) AP24(7.62,-20.32) AP26(10.16,-20.32) AP28(12.7,-20.32) AP30(15.24,-20.32) AP32(17.78,-20.32) AP34(20.32,-20.32) AR1(-21.59,-21.59) AR3(-19.05,-21.59) AR5(-16.51,-21.59) AR7(-13.97,-21.59) AR9(-11.43,-21.59) AR11(-8.89,-21.59) AR13(-6.35,-21.59) AR15(-3.81,-21.59) AR17(-1.27,-21.59) AR19(1.27,-21.59) AR21(3.81,-21.59) AR23(6.35,-21.59) AR25(8.89,-21.59) AR27(11.43,-21.59) AR29(13.97,-21.59) AR31(16.51,-21.59) AR33(19.05,-21.59) AR35(21.59,-21.59) B2(-20.32,20.32) B4(-17.78,20.32) B6(-15.24,20.32) B8(-12.7,20.32) B10(-10.16,20.32) B12(-7.62,20.32) B14(-5.08,20.32) B16(-2.54,20.32) B18(0,20.32) B20(2.54,20.32) B22(5.08,20.32) B24(7.62,20.32) B26(10.16,20.32) B28(12.7,20.32) B30(15.24,20.32) B32(17.78,20.32) B34(20.32,20.32) C1(-21.59,19.05) C3(-19.05,19.05) C5(-16.51,19.05) C7(-13.97,19.05) C9(-11.43,19.05) C11(-8.89,19.05) C13(-6.35,19.05) C15(-3.81,19.05) C17(-1.27,19.05) C19(1.27,19.05) C21(3.81,19.05) C23(6.35,19.05) C25(8.89,19.05) C27(11.43,19.05) C29(13.97,19.05) C31(16.51,19.05) C33(19.05,19.05) C35(21.59,19.05) D2(-20.32,17.78) D4(-17.78,17.78) D6(-15.24,17.78) D8(-12.7,17.78) D10(-10.16,17.78) D12(-7.62,17.78) D14(-5.08,17.78) D16(-2.54,17.78) D18(0,17.78) D20(2.54,17.78) D22(5.08,17.78) D24(7.62,17.78) D26(10.16,17.78) D28(12.7,17.78) D30(15.24,17.78) D32(17.78,17.78) D34(20.32,17.78) E1(-21.59,16.51) E3(-19.05,16.51) E5(-16.51,16.51) E7(-13.97,16.51) E9(-11.43,16.51) E11(-8.89,16.51) E13(-6.35,16.51) E15(-3.81,16.51) E17(-1.27,16.51) E19(1.27,16.51) E21(3.81,16.51) E23(6.35,16.51) E25(8.89,16.51) E27(11.43,16.51) E29(13.97,16.51) E31(16.51,16.51) E33(19.05,16.51) E35(21.59,16.51) F2(-20.32,15.24) F4(-17.78,15.24) F6(-15.24,15.24) F8(-12.7,15.24) F10(-10.16,15.24) F12(-7.62,15.24) F24(7.62,15.24) F26(10.16,15.24) F28(12.7,15.24) F32(17.78,15.24) F34(20.32,15.24) G1(-21.59,13.97) G3(-19.05,13.97) G5(-16.51,13.97) G31(16.51,13.97) G33(19.05,13.97) G35(21.59,13.97) H2(-20.32,12.7) H4(-17.78,12.7) H6(-15.24,12.7) H30(15.24,12.7) H32(17.78,12.7) H34(20.32,12.7) J1(-21.59,11.43) J3(-19.05,11.43) J5(-16.51,11.43) J31(16.51,11.43) J33(19.05,11.43) J35(21.59,11.43) K2(-20.32,10.16) K4(-17.78,10.16) K6(-15.24,10.16) K30(15.24,10.16) K32(17.78,10.16) K34(20.32,10.16) L1(-21.59,8.89) L3(-19.05,8.89) L5(-16.51,8.89) L31(16.51,8.89) L33(19.05,8.89) L35(21.59,8.89) M2(-20.32,7.62) M4(-17.78,7.62) M6(-15.24,7.62) M30(15.24,7.62) M32(17.78,7.62) M34(20.32,7.62) N1(-21.59,6.35) N3(-19.05,6.35) N5(-16.51,6.35) N31(16.51,6.35) N33(19.05,6.35) N35(21.59,6.35) P2(-20.32,5.08) P4(-17.78,5.08) P32(17.78,5.08) P34(20.32,5.08) R1(-21.59,3.81) R3(-19.05,3.81) R5(-16.51,3.81) R31(16.51,3.81) R33(19.05,3.81) R35(21.59,3.81) T2(-20.32,2.54) T4(-17.78,2.54) T32(17.78,2.54) T34(20.32,2.54) U1(-21.59,1.27) U3(-19.05,1.27) U5(-16.51,1.27) U31(16.51,1.27) U33(19.05,1.27) U35(21.59,1.27) V2(-20.32,0) V4(-17.78,0) V32(17.78,0) V34(20.32,0) W1(-21.59,-1.27) W3(-19.05,-1.27) W5(-16.51,-1.27) W31(16.51,-1.27) W33(19.05,-1.27) W35(21.59,-1.27) Y2(-20.32,-2.54) Y4(-17.78,-2.54) Y32(17.78,-2.54) Y34(20.32,-2.54)